# Altium footprint library CeleronLib_THD.PcbLib: 217 footprints (part 3 of 14)
Each footprint in its own frame and in the unit in brackets; x right, y up, seen from the top. Pads: shape width x height; smd on the part's side, far side on the other; paste and mask are expansions set on the pad; w line width, h text height; cw(c..) or ccw(c..) is an arc to the next point about the centre after c.
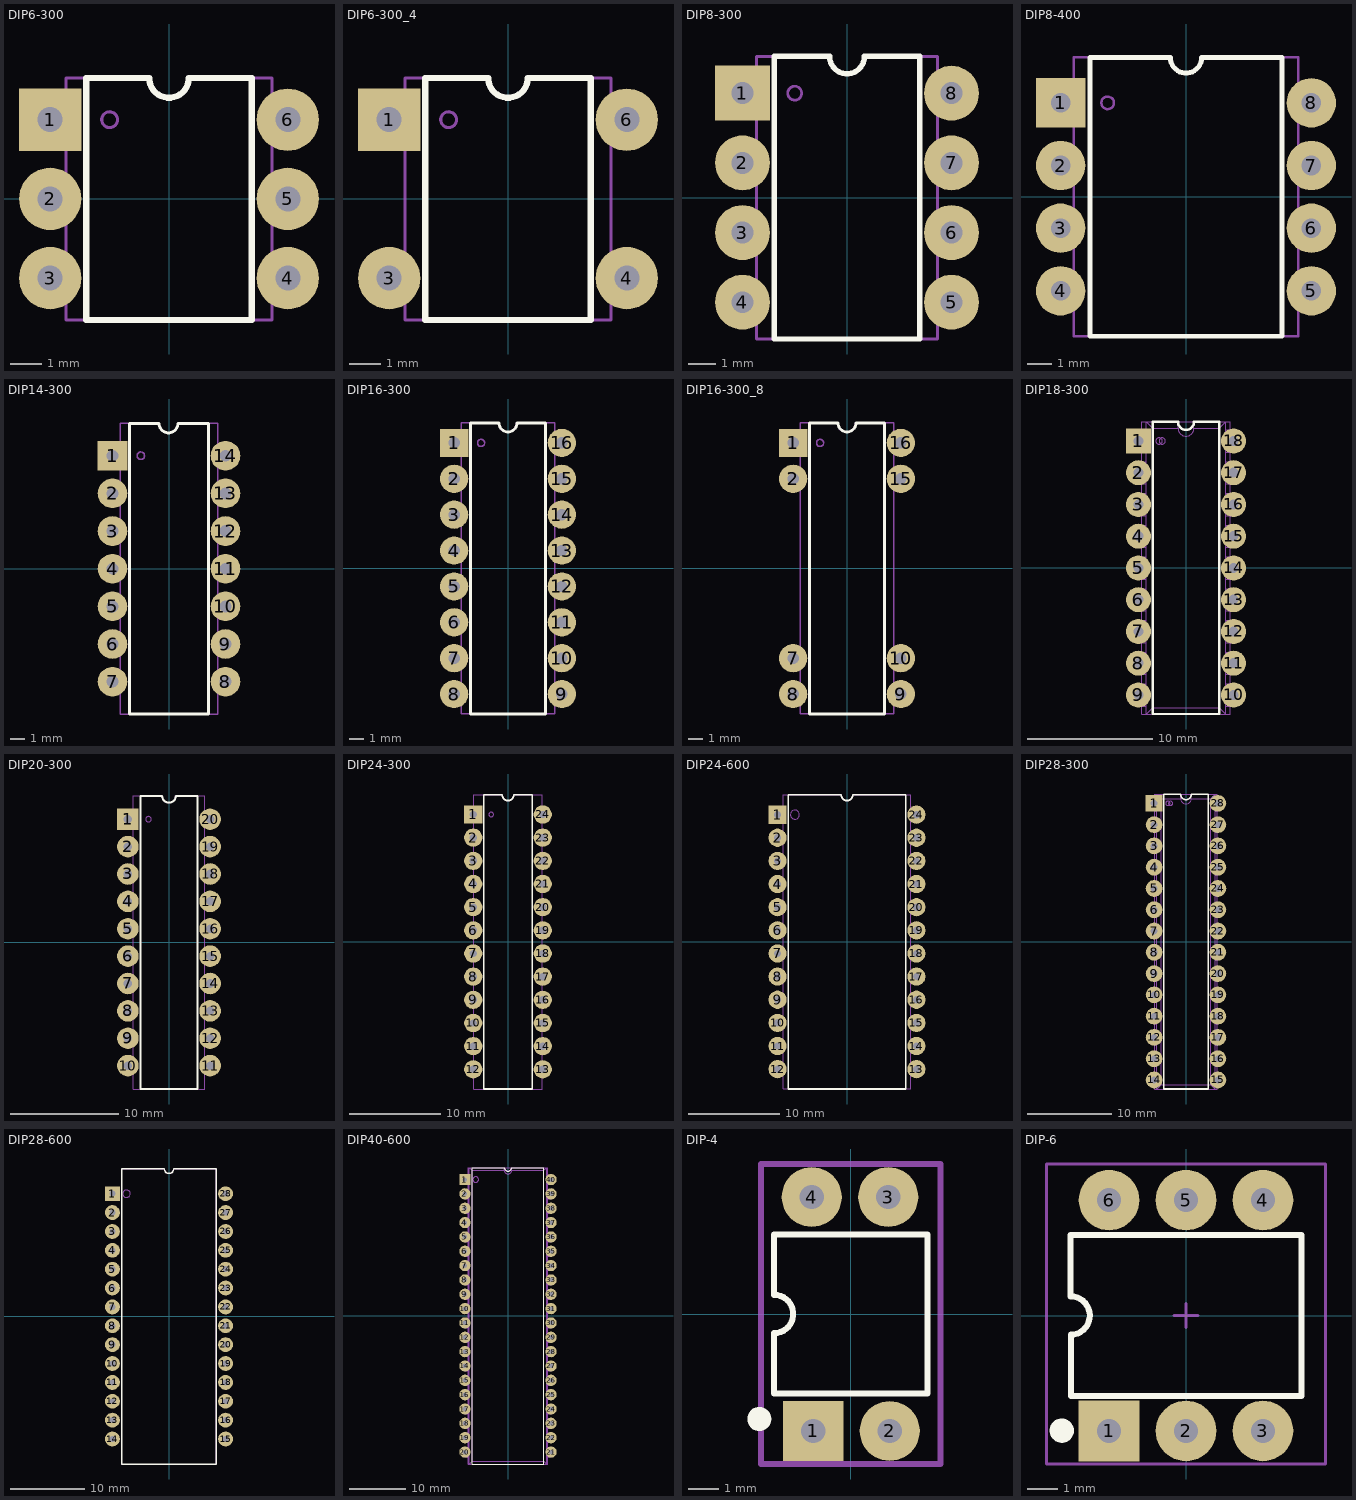
[diagram p2: the footprints below, top view; thin cyan lines are the x and y axes]

## DIP6-300 [mm] "DIP 6 Leads, Row Spacing 7.62 mm; Pitch 2.54 mm"
height 5.08
pads (6):
  rect 2x2 hole 0.8: 1(-3.81,2.54)
  round 2 hole 0.8: 2(-3.81,0) 3(-3.81,-2.54) 4(3.81,-2.54) 5(3.81,0) 6(3.81,2.54)
Top Overlay:
  lines w0.2: -0.635,3.88 ccw(c0,3.88) 0.635,3.88 ; -0.635,3.88 ccw(c0,3.88) 0.635,3.88 ; -0.635,3.88 -2.65,3.88 -2.65,-3.88 2.65,-3.88 2.65,3.88 0.635,3.88
Top Assy:
  circle w0.1: c-1.905,2.54 r0.254
  lines w0.1: -3.3,-3.88 3.3,-3.88 3.3,3.88 0.635,3.88 cw(c0,3.88) -0.635,3.88 -3.3,3.88 -3.3,-3.88
3D body: height 5.33, standoff -3.3, extent -3.935,-3.81 3.935,3.81

## DIP6-300_4 [mm] "DIP 6, 4 Leads, Row Spacing 7.62 mm; Pitch 2.54 mm"
height 5.08
pads (4):
  rect 2x2 hole 0.8: 1(-3.81,2.54)
  round 2 hole 0.8: 3(-3.81,-2.54) 4(3.81,-2.54) 6(3.81,2.54)
Top Overlay:
  lines w0.2: -0.635,3.88 ccw(c0,3.88) 0.635,3.88 ; -0.635,3.88 ccw(c0,3.88) 0.635,3.88 ; -0.635,3.88 -2.65,3.88 -2.65,-3.88 2.65,-3.88 2.65,3.88 0.635,3.88
Top Assy:
  circle w0.1: c-1.905,2.54 r0.254
  lines w0.1: -3.3,-3.88 3.3,-3.88 3.3,3.88 0.6,3.88 cw(c-0.035,3.88) -0.67,3.88 -3.3,3.88 -3.3,-3.88
3D body: height 5.33, standoff -3.3, extent -3.935,-3.81 3.935,3.81

## DIP8-300 [mm] "DIP 8 Leads, Row Spacing 7.62 mm; Pitch 2.54 mm"
height 5.08
pads (8):
  rect 2x2 hole 0.8: 1(-3.81,3.81)
  round 2 hole 0.8: 2(-3.81,1.27) 3(-3.81,-1.27) 4(-3.81,-3.81) 5(3.81,-3.81) 6(3.81,-1.27) 7(3.81,1.27) 8(3.81,3.81)
Top Overlay:
  lines w0.2: -0.635,5.15 ccw(c0,5.15) 0.635,5.15 ; -0.635,5.15 ccw(c0,5.15) 0.635,5.15 ; -0.635,5.15 -2.65,5.15 -2.65,-5.15 2.65,-5.15 2.65,5.15 0.635,5.15
Top Assy:
  circle w0.1: c-1.905,3.81 r0.254
  lines w0.1: -3.3,-5.15 3.3,-5.15 3.3,5.15 0.635,5.15 cw(c0,5.15) -0.635,5.15 -3.3,5.15 -3.3,-5.15
3D body: height 5.33, standoff -3.3, extent -3.935,-5.08 3.935,5.08

## DIP8-400 [mm] "DIP 8 Leads, Row Spacing 10.16mm; Pitch 2.54 mm"
height 5.08
pads (8):
  rect 2x2 hole 0.8: 1(-5.08,3.81)
  round 2 hole 0.8: 2(-5.08,1.27) 3(-5.08,-1.27) 4(-5.08,-3.81) 5(5.08,-3.81) 6(5.08,-1.27) 7(5.08,1.27) 8(5.08,3.81)
Top Overlay:
  lines w0.2: -3.9,-5.65 -3.9,5.65 -0.635,5.65 ccw(c0,5.65) 0.635,5.65 3.9,5.65 3.9,-5.65 -3.9,-5.65
Top Assy:
  circle w0.1: c-3.175,3.81 r0.254
  lines w0.1: -4.55,-5.65 4.55,-5.65 4.55,5.65 0.62,5.65 cw(c-0.015,5.65) -0.65,5.65 -4.55,5.65 -4.55,-5.65
3D body: height 5.33, standoff -3.3, extent -5.205,-5.65 5.205,5.65

## DIP14-300 [mm] "DIP 14 Leads, Row Spacing 7.62 mm; Pitch 2.54 mm"
height 5.08
pads (14):
  rect 2x2 hole 0.8: 1(-3.81,7.62)
  round 2 hole 0.8: 2(-3.81,5.08) 3(-3.81,2.54) 4(-3.81,0) 5(-3.81,-2.54) 6(-3.81,-5.08) 7(-3.81,-7.62) 8(3.81,-7.62) 9(3.81,-5.08) 10(3.81,-2.54) 11(3.81,0) 12(3.81,2.54) 13(3.81,5.08) 14(3.81,7.62)
Top Overlay:
  lines w0.2: -0.685,9.8 -2.65,9.8 -2.65,-9.8 2.65,-9.8 2.65,9.8 ; -0.67,9.8 ccw(c-0.035,9.8) 0.6,9.8 2.615,9.8
Top Assy:
  circle w0.1: c-1.905,7.62 r0.254
  lines w0.1: -3.3,-9.8 -3.3,9.8 -0.67,9.8 ccw(c-0.035,9.8) 0.6,9.8 3.3,9.8 3.3,-9.8 -3.3,-9.8
3D body: height 5.33, standoff -3.3, extent -3.935,-9.845 3.935,9.845

## DIP16-300 [mm] "DIP 16 Leads, Row Spacing 7.62 mm; Pitch 2.54 mm"
height 5.08
pads (16):
  rect 2x2 hole 0.8: 1(-3.81,8.89)
  round 2 hole 0.8: 2(-3.81,6.35) 3(-3.81,3.81) 4(-3.81,1.27) 5(-3.81,-1.27) 6(-3.81,-3.81) 7(-3.81,-6.35) 8(-3.81,-8.89) 9(3.81,-8.89) 10(3.81,-6.35) 11(3.81,-3.81) 12(3.81,-1.27) 13(3.81,1.27) 14(3.81,3.81) 15(3.81,6.35) 16(3.81,8.89)
Top Overlay:
  lines w0.2: -2.65,-10.3 2.65,-10.3 2.65,10.3 0.635,10.3 cw(c0,10.3) -0.635,10.3 -2.65,10.3 -2.65,-10.3
Top Assy:
  circle w0.1: c-1.905,8.89 r0.254
  lines w0.1: -3.3,-10.3 -3.3,10.3 -0.67,10.3 ccw(c-0.035,10.3) 0.6,10.3 3.3,10.3 3.3,-10.3 -3.3,-10.3
3D body: height 5.33, standoff -3.3, extent -3.935,-10.16 3.935,10.16

## DIP16-300_8 [mm] "DIP 16 Leads, Row Spacing 7.62 mm; Pitch 2.54 mm"
height 5.08
pads (8):
  rect 2x2 hole 0.8: 1(-3.81,8.89)
  round 2 hole 0.8: 2(-3.81,6.35) 7(-3.81,-6.35) 8(-3.81,-8.89) 9(3.81,-8.89) 10(3.81,-6.35) 15(3.81,6.35) 16(3.81,8.89)
Top Overlay:
  lines w0.2: -2.65,-10.3 2.65,-10.3 2.65,10.3 0.635,10.3 cw(c0,10.3) -0.635,10.3 -2.65,10.3 -2.65,-10.3
Top Assy:
  circle w0.1: c-1.905,8.89 r0.254
  lines w0.1: -3.3,-10.3 -3.3,10.3 -0.67,10.3 ccw(c-0.035,10.3) 0.6,10.3 3.3,10.3 3.3,-10.3 -3.3,-10.3
3D body: height 5.33, standoff -3.3, extent -3.935,-10.16 3.935,10.16

## DIP18-300 [mm] "DIP 18 Leads, Row Spacing 7.62 mm; Pitch 2.54 mm"
height 5.08
pads (18):
  rect 2x2 hole 0.8: 1(-3.81,10.16)
  round 2 hole 0.8: 2(-3.81,7.62) 3(-3.81,5.08) 4(-3.81,2.54) 5(-3.81,0) 6(-3.81,-2.54) 7(-3.81,-5.08) 8(-3.81,-7.62) 9(-3.81,-10.16) 10(3.81,-10.16) 11(3.81,-7.62) 12(3.81,-5.08) 13(3.81,-2.54) 14(3.81,0) 15(3.81,2.54) 16(3.81,5.08) 17(3.81,7.62) 18(3.81,10.16)
Top Overlay:
  lines w0.2: -2.65,-11.685 -2.65,11.685 -0.635,11.685 ccw(c0,11.685) 0.635,11.685 2.65,11.685 2.65,-11.685 -2.65,-11.685
Mechanical 8:
  circle w0.05: c-2.159,10.16 r0.254
  lines w0.05: -3.175,-11.05 -3.81,-11.05 -3.81,-10.44 -3.935,-10.44 -3.935,-9.88 -3.81,-9.88 -3.81,-9.27 -3.175,-9.27 ; -3.175,-8.51 -3.81,-8.51 -3.81,-7.9 -3.935,-7.9 -3.935,-7.34 -3.81,-7.34 -3.81,-6.73 -3.175,-6.73 ; -3.175,-5.97 -3.81,-5.97 -3.81,-5.36 -3.935,-5.36 -3.935,-4.8 -3.81,-4.8 -3.81,-4.19 -3.175,-4.19 ; -3.175,-3.43 -3.81,-3.43 -3.81,-2.82 -3.935,-2.82 -3.935,-2.26 -3.81,-2.26 -3.81,-1.65 -3.175,-1.65 ; -3.175,-0.89 -3.81,-0.89 -3.81,-0.28 -3.935,-0.28 -3.935,0.28 -3.81,0.28 -3.81,0.89 -3.175,0.89 ; -3.175,1.65 -3.81,1.65 -3.81,2.26 -3.935,2.26 -3.935,2.82 -3.81,2.82 -3.81,3.43 -3.175,3.43 ; -3.175,4.19 -3.81,4.19 -3.81,4.8 -3.935,4.8 -3.935,5.36 -3.81,5.36 -3.81,5.97 -3.175,5.97 ; -3.175,6.73 -3.81,6.73 -3.81,7.34 -3.935,7.34 -3.935,7.9 -3.81,7.9 -3.81,8.51 -3.175,8.51 ; -3.175,9.27 -3.81,9.27 -3.81,9.88 -3.935,9.88 -3.935,10.44 -3.81,10.44 -3.81,11.05 -3.175,11.05 ; -0.635,11.685 -0.635,11.177 ; 0.635,11.685 0.635,11.177 ; 3.175,-11.05 3.81,-11.05 3.81,-10.44 3.935,-10.44 3.935,-9.88 3.81,-9.88 3.81,-9.27 3.175,-9.27 ; 3.175,-8.51 3.81,-8.51 3.81,-7.9 3.935,-7.9 3.935,-7.34 3.81,-7.34 3.81,-6.73 3.175,-6.73 ; 3.175,-5.97 3.81,-5.97 3.81,-5.36 3.935,-5.36 3.935,-4.8 3.81,-4.8 3.81,-4.19 3.175,-4.19 ; 3.175,-3.43 3.81,-3.43 3.81,-2.82 3.935,-2.82 3.935,-2.26 3.81,-2.26 3.81,-1.65 3.175,-1.65 ; 3.175,-0.89 3.81,-0.89 3.81,-0.28 3.935,-0.28 3.935,0.28 3.81,0.28 3.81,0.89 3.175,0.89 ; 3.175,1.65 3.81,1.65 3.81,2.26 3.935,2.26 3.935,2.82 3.81,2.82 3.81,3.43 3.175,3.43 ; 3.175,4.19 3.81,4.19 3.81,4.8 3.935,4.8 3.935,5.36 3.81,5.36 3.81,5.97 3.175,5.97 ; 3.175,6.73 3.81,6.73 3.81,7.34 3.935,7.34 3.935,7.9 3.81,7.9 3.81,8.51 3.175,8.51 ; 3.175,9.27 3.81,9.27 3.81,9.88 3.935,9.88 3.935,10.44 3.81,10.44 3.81,11.05 3.175,11.05 ; -3.175,-11.685 -2.667,-11.177 ; -3.175,-11.685 -3.175,11.685 ; -3.175,-11.685 3.175,-11.685 ; -3.175,11.685 -2.667,11.177 ; -3.175,11.685 3.175,11.685 ; -2.667,-11.177 -2.667,11.177 ; -2.667,-11.177 2.667,-11.177 ; -2.667,11.177 -0.635,11.177 ; -0.635,11.177 ccw(c0,11.177) 0.635,11.177 ; 0.635,11.177 2.667,11.177 ; 2.667,-11.177 3.175,-11.685 ; 2.667,-11.177 2.667,11.177 ; 2.667,11.177 3.175,11.685 ; 3.175,-11.685 3.175,11.685
Top Assy:
  circle w0.1: c-1.905,10.16 r0.254
  lines w0.1: -3.555,-11.685 3.555,-11.685 3.555,11.685 0.635,11.685 cw(c0,11.685) -0.635,11.685 -3.555,11.685 -3.555,-11.685
3D body: height 5.33, standoff -3.3, extent -3.935,-11.685 3.935,11.685

## DIP20-300 [mm] "DIP 20 Leads, Row Spacing 7.62 mm; Pitch 2.54 mm"
height 5.08
pads (20):
  rect 2x2 hole 0.8: 1(-3.81,11.43)
  round 2 hole 0.8: 2(-3.81,8.89) 3(-3.81,6.35) 4(-3.81,3.81) 5(-3.81,1.27) 6(-3.81,-1.27) 7(-3.81,-3.81) 8(-3.81,-6.35) 9(-3.81,-8.89) 10(-3.81,-11.43) 11(3.81,-11.43) 12(3.81,-8.89) 13(3.81,-6.35) 14(3.81,-3.81) 15(3.81,-1.27) 16(3.81,1.27) 17(3.81,3.81) 18(3.81,6.35) 19(3.81,8.89) 20(3.81,11.43)
Top Overlay:
  lines w0.2: -2.65,-13.6 -2.65,13.6 -0.635,13.6 ccw(c0,13.6) 0.635,13.6 2.65,13.6 2.65,-13.6 -2.65,-13.6
Top Assy:
  circle w0.1: c-1.905,11.43 r0.254
  lines w0.1: -3.3,-13.6 -3.3,13.6 -0.67,13.6 ccw(c-0.035,13.6) 0.6,13.6 3.3,13.6 3.3,-13.6 -3.3,-13.6
3D body: height 5.33, standoff -3.3, extent -3.935,-13.46 3.935,13.46

## DIP24-300 [mm] "DIP 24 Leads, Row Spacing 7.62mm; Pitch 2.54mm"
height 5.08
pads (24):
  rect 2x2 hole 0.8: 1(-3.81,13.97)
  round 2 hole 0.8: 2(-3.81,11.43) 3(-3.81,8.89) 4(-3.81,6.35) 5(-3.81,3.81) 6(-3.81,1.27) 7(-3.81,-1.27) 8(-3.81,-3.81) 9(-3.81,-6.35) 10(-3.81,-8.89) 11(-3.81,-11.43) 12(-3.81,-13.97) 13(3.81,-13.97) 14(3.81,-11.43) 15(3.81,-8.89) 16(3.81,-6.35) 17(3.81,-3.81) 18(3.81,-1.27) 19(3.81,1.27) 20(3.81,3.81) 21(3.81,6.35) 22(3.81,8.89) 23(3.81,11.43) 24(3.81,13.97)
Top Overlay:
  lines w0.2: -2.65,-16.13 2.65,-16.13 2.65,16.13 0.635,16.13 cw(c0,16.13) -0.635,16.13 -2.65,16.13 -2.65,-16.13
Top Assy:
  circle w0.1: c-1.84,13.97 r0.254
  lines w0.1: -3.745,-16.13 3.745,-16.13 3.745,16.13 0.635,16.13 cw(c0,16.13) -0.635,16.13 -3.745,16.13 -3.745,-16.13
3D body: height 5.08, standoff -3.3, extent -3.935,-16.13 3.935,16.13

## DIP24-600 [mm] "24 Leads Dual In-Line Package, Row Spacing 15.24mm; Pitch 2.54mm"
height 5.1
pads (24):
  rect 2x2 hole 0.8: 1(-7.62,13.97)
  round 2 hole 0.8: 2(-7.62,11.43) 3(-7.62,8.89) 4(-7.62,6.35) 5(-7.62,3.81) 6(-7.62,1.27) 7(-7.62,-1.27) 8(-7.62,-3.81) 9(-7.62,-6.35) 10(-7.62,-8.89) 11(-7.62,-11.43) 12(-7.62,-13.97) 13(7.62,-13.97) 14(7.62,-11.43) 15(7.62,-8.89) 16(7.62,-6.35) 17(7.62,-3.81) 18(7.62,-1.27) 19(7.62,1.27) 20(7.62,3.81) 21(7.62,6.35) 22(7.62,8.89) 23(7.62,11.43) 24(7.62,13.97)
Top Overlay:
  lines w0.2: -6.45,-16.15 6.45,-16.15 6.45,16.15 0.635,16.15 cw(c0,16.15) -0.635,16.15 -6.45,16.15 -6.45,-16.15
Top Assy:
  circle w0.1: c-5.715,13.97 r0.5
  lines w0.1: -7,-16.15 7,-16.15 7,16.15 0.635,16.15 cw(c0,16.15) -0.635,16.15 -7,16.15 -7,-16.15
3D body: height 5.72, standoff -3.3, extent -7.745,-16 7.745,16

## DIP28-300 [mm] "DIP 28 Leads, Row Spacing 7.62mm; Pitch 2.54mm"
height 4.57
pads (28):
  rect 2x2 hole 0.8: 1(-3.81,16.51)
  round 2 hole 0.8: 2(-3.81,13.97) 3(-3.81,11.43) 4(-3.81,8.89) 5(-3.81,6.35) 6(-3.81,3.81) 7(-3.81,1.27) 8(-3.81,-1.27) 9(-3.81,-3.81) 10(-3.81,-6.35) 11(-3.81,-8.89) 12(-3.81,-11.43) 13(-3.81,-13.97) 14(-3.81,-16.51) 15(3.81,-16.51) 16(3.81,-13.97) 17(3.81,-11.43) 18(3.81,-8.89) 19(3.81,-6.35) 20(3.81,-3.81) 21(3.81,-1.27) 22(3.81,1.27) 23(3.81,3.81) 24(3.81,6.35) 25(3.81,8.89) 26(3.81,11.43) 27(3.81,13.97) 28(3.81,16.51)
Top Overlay:
  lines w0.2: -2.65,-17.59 2.65,-17.59 2.65,17.59 0.635,17.59 cw(c0,17.59) -0.635,17.59 -2.65,17.59 -2.65,-17.59
Mechanical 8:
  drawing of 205 lines, arcs and shapes, not listed
Top Assy:
  circle w0.1: c-1.84,16.51 r0.254
  lines w0.1: -3.745,-17.59 3.745,-17.59 3.745,17.59 0.635,17.59 cw(c0,17.59) -0.635,17.59 -3.745,17.59 -3.745,-17.59
3D body: height 4.57, standoff -3.3, extent -3.935,-17.59 3.935,17.59

## DIP28-600 [mm] "28 Leads Dual In-Line Package, Row Spacing 15.24mm; Pitch 2.54mm"
height 5.59
pads (28):
  rect 2x2 hole 0.8: 1(-7.62,16.51)
  round 2 hole 0.8: 2(-7.62,13.97) 3(-7.62,11.43) 4(-7.62,8.89) 5(-7.62,6.35) 6(-7.62,3.81) 7(-7.62,1.27) 8(-7.62,-1.27) 9(-7.62,-3.81) 10(-7.62,-6.35) 11(-7.62,-8.89) 12(-7.62,-11.43) 13(-7.62,-13.97) 14(-7.62,-16.51) 15(7.62,-16.51) 16(7.62,-13.97) 17(7.62,-11.43) 18(7.62,-8.89) 19(7.62,-6.35) 20(7.62,-3.81) 21(7.62,-1.27) 22(7.62,1.27) 23(7.62,3.81) 24(7.62,6.35) 25(7.62,8.89) 26(7.62,11.43) 27(7.62,13.97) 28(7.62,16.51)
Top Overlay:
  lines w0.2: -6.35,-19.875 -6.35,19.875 -0.635,19.875 ccw(c0,19.875) 0.635,19.875 6.35,19.875 6.35,-19.875 -6.35,-19.875
Top Assy:
  circle w0.1: c-5.715,16.51 r0.5
  lines w0.1: -6.35,-19.875 -6.35,19.875 -0.635,19.875 ccw(c0,19.875) 0.635,19.875 6.35,19.875 6.35,-19.875 -6.35,-19.875
3D body: height 5.33, standoff -3.3, extent -7.745,-19.875 7.745,19.875

## DIP40-600 [mm] "40 Leads Dual In-Line Package, Row Spacing 15.24mm; Pitch 2.54mm"
height 4.7
pads (40):
  rect 2x2 hole 0.8: 1(-7.62,24.13)
  round 2 hole 0.8: 2(-7.62,21.59) 3(-7.62,19.05) 4(-7.62,16.51) 5(-7.62,13.97) 6(-7.62,11.43) 7(-7.62,8.89) 8(-7.62,6.35) 9(-7.62,3.81) 10(-7.62,1.27) 11(-7.62,-1.27) 12(-7.62,-3.81) 13(-7.62,-6.35) 14(-7.62,-8.89) 15(-7.62,-11.43) 16(-7.62,-13.97) 17(-7.62,-16.51) 18(-7.62,-19.05) 19(-7.62,-21.59) 20(-7.62,-24.13) 21(7.62,-24.13) 22(7.62,-21.59) 23(7.62,-19.05) 24(7.62,-16.51) 25(7.62,-13.97) 26(7.62,-11.43) 27(7.62,-8.89) 28(7.62,-6.35) 29(7.62,-3.81) 30(7.62,-1.27) 31(7.62,1.27) 32(7.62,3.81) 33(7.62,6.35) 34(7.62,8.89) 35(7.62,11.43) 36(7.62,13.97) 37(7.62,16.51) 38(7.62,19.05) 39(7.62,21.59) 40(7.62,24.13)
Top Overlay:
  lines w0.2: -6.35,-26.25 6.35,-26.25 6.35,26.25 0.635,26.25 cw(c0,26.25) -0.635,26.25 -6.35,26.25 -6.35,-26.25
Mechanical 8:
  drawing of 297 lines, arcs and shapes, not listed
Top Assy:
  circle w0.1: c-5.715,24.13 r0.5
  lines w0.1: -7.05,-26.25 7.05,-26.25 7.05,26.25 0.635,26.25 cw(c0,26.25) -0.635,26.25 -7.05,26.25 -7.05,-26.25
3D body: height 4.7, standoff -3.05, extent -7.8,-26.25 7.8,26.25

## DIP-4 [mm] "DIP; 4 Leads; Row Spacing 7.62 mm; Pitch 2.54 mm"
height 5.6
pads (4):
  rect 2x2 hole 0.8: 1(-1.25,-3.9)
  round 2 hole 0.8: 2(1.3,-3.9) 3(1.25,3.9) 4(-1.3,3.9)
Top Overlay:
  circle w0.4: c-3.05,-3.5 r0.2
  lines w0.2: -2.55,-2.65 2.55,-2.65 2.55,2.65 -2.55,2.65 -2.55,0.635 cw(c-2.55,0) -2.55,-0.635 -2.55,-2.65
Top Courtyard:
  lines w0.2: -3,-5 -3,5 3,5 3,-5 -3,-5
3D body: height 4.65, standoff -2.3, extent -2.29,-4.4 2.29,4.4

## DIP-6 [mm] "6-Pin Plastic Dual In-Line Package (PDIP) Row Spacing 9 mm; Pitch 2.54 mm"
height 6.6
pads (6):
  rect 2x2 hole 0.8: 1(-2.54,-3.81)
  round 2 hole 0.8: 2(0,-3.81) 3(2.54,-3.81) 4(2.54,3.81) 5(0,3.81) 6(-2.54,3.81)
Top Overlay:
  circle w0.4: c-4.1,-3.8 r0.2
  lines w0.2: -3.81,0.635 cw(c-3.81,0) -3.8,-0.635 ; -3.81,0.65 -3.81,2.65 3.81,2.65 3.81,-2.65 -3.8,-2.65 -3.8,-0.65
Top Courtyard:
  lines w0.1: -0.4,0 0.4,0 ; 0,-0.4 0,0.4 ; -4.6,-4.9 -4.6,5 4.6,5 4.6,-4.9 -4.6,-4.9
3D body: height 4.81, standoff -2.78, extent -4.05,-4.05 4.03,3.95